# Altium footprint library 10-Diobe.PcbLib: 108 footprints (part 4 of 7)
Each footprint in its own frame and in the unit in brackets; x right, y up, seen from the top. Pads: shape width x height; smd on the part's side, far side on the other; paste and mask are expansions set on the pad; w line width, h text height; cw(c..) or ccw(c..) is an arc to the next point about the centre after c.
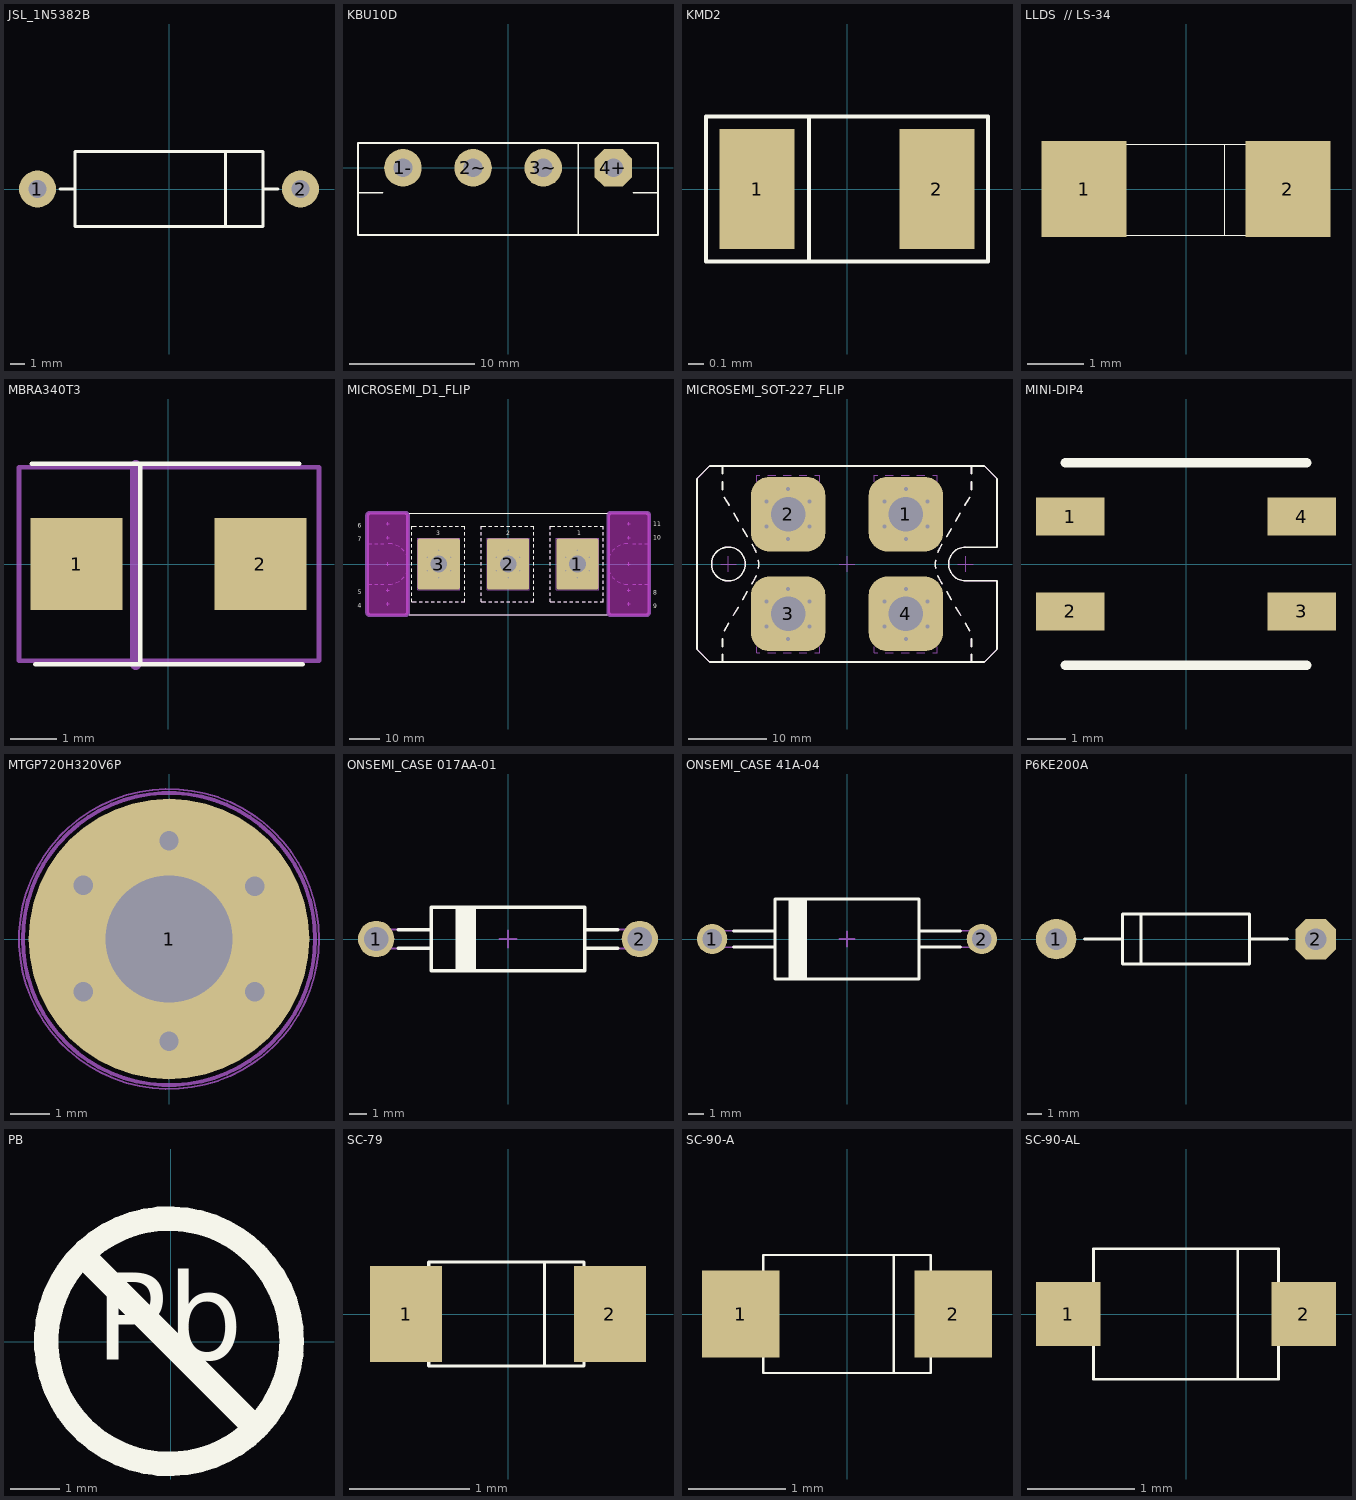
[diagram p3: the footprints below, top view; thin cyan lines are the x and y axes]

## JSL_1N5382B [mm]
height 12.22
pads (2):
  round 2.5 hole 1.2: 1(-8.89,0) 2(8.89,0)
Top Overlay:
  lines w0.2: -7.366,0 -6.35,0 ; 3.81,-2.54 3.81,2.54 ; 6.35,0 7.366,0 ; -6.35,-2.54 6.35,-2.54 6.35,2.54 -6.35,2.54 -6.35,-2.54
3D body "v280-170.stp": height 0.02, standoff -1.65, extent 7.49,-1.4 10.29,1.4
3D body "v280-170.stp": height 0.02, standoff -1.65, extent -10.29,-1.4 -7.49,1.4
3D body "1n5349.stp": height 3.81, standoff -2.5, extent -9.42,-1.905 9.42,1.907

## KBU10D [mm]
height 12.22
pads (4):
  round 3 hole 1.5: 1-(-8.4,0)
  round 3 hole 1.5 mask+0.07: 2~(-2.8,0) 3~(2.8,0)
  oct 3x3 hole 1.5 mask+0.07: 4+(8.4,0)
Top Overlay:
  lines w0.127: -11.913,-1.981 -10.033,-1.981 ; 5.588,-5.347 5.588,1.981 ; 10.008,-1.981 11.913,-1.981 ; -11.989,-5.359 -11.989,1.981 11.963,1.981 11.963,-5.359 -11.989,-5.359
3D body "kbu10x.stp": height 19.3, standoff -3.3, extent -11.85,-5.252 11.85,1.848
3D body "v280-170.stp": height 0.02, standoff -1.65, extent -9.8,-1.4 -7,1.4
3D body "v280-170.stp": height 0.02, standoff -1.65, extent -4.2,-1.4 -1.4,1.4
3D body "v280-170.stp": height 0.02, standoff -1.65, extent 1.4,-1.4 4.2,1.4
3D body "v280-170.stp": height 0.02, standoff -1.65, extent 7,-1.4 9.8,1.4

## KMD2 [mm]
height 12.22
pads (2):
  rect 0.5x0.8 smd mask+0.051: 1(-0.6,0) 2(0.6,0)
Top Overlay:
  lines w0.025: -0.254,-0.483 -0.254,0.483 ; -0.94,-0.483 -0.94,0.483 0.94,0.483 0.94,-0.483 -0.94,-0.483
3D body "kmd2.stp": height 0.6, standoff 0, extent -0.813,-0.406 0.787,0.394
3D body "p080-050.stp": height 0.02, standoff 0, extent 0.35,-0.4 0.85,0.4
3D body "p080-050.stp": height 0.02, standoff 0, extent -0.85,-0.4 -0.35,0.4

## LLDS  // LS-34 [mm] "DO35 // 1n4148"
height 12.22
pads (2):
  rect 1.5x1.7 smd mask+0.051: 1(-1.8,0) 2(1.8,0)
Top Overlay:
  lines w0.005: 0.686,-0.813 0.686,0.787 ; -1.88,-0.813 1.829,-0.813 1.829,0.787 -1.88,0.787 -1.88,-0.813
3D body "llds.stp": height 1.5, standoff 0, extent -1.7,-0.762 1.7,0.746
3D body "p170-150.stp": height 0.02, standoff 0, extent -2.55,-0.85 -1.05,0.85
3D body "p170-150.stp": height 0.02, standoff 0, extent 1.05,-0.85 2.55,0.85

## MBRA340T3 [mm]
height 12.22
pads (2):
  rect 2x2 smd: 1(-2,0) 2(2,0)
Top Overlay:
  lines w0.1: -2.972,2.184 2.845,2.184 ; -2.896,-2.184 2.921,-2.184 ; -0.61,-2.184 -0.61,2.184
Mechanical 11:
  lines w0.1: -3.251,-2.108 -3.251,2.108 3.277,2.108 3.277,-2.108 -3.251,-2.108
  lines w0.254: -0.711,-2.184 -0.711,2.134
3D body "2_2-1_6-ms73.stp": height 0.02, standoff 0, extent -3.01,-1.1 -1.41,1.1
3D body "2_2-1_6-ms73.stp": height 0.02, standoff 0, extent 1.435,-1.1 3.035,1.1
3D body "sma.stp": height 2.42, standoff 0, extent -3.185,-2.03 3.185,2.03

## MICROSEMI_D1_FLIP [mm] "MICROSEMI D1 Package Module, Body 94mm x 34mm, Screws on PCB Version"
height 31
pads (3):
  rrect10% 14x17 hole 5.5: 1(23,0) 2(0,0) 3(-23,0)
via 26.897,-2.25 diameter 1 hole 0.5
via 26.897,2.25 diameter 1 hole 0.5
via 19.103,-2.25 diameter 1 hole 0.5
via 23,4.5 diameter 1 hole 0.5
via 19.103,2.25 diameter 1 hole 0.5
via 23,-4.5 diameter 1 hole 0.5
via 0,-4.5 diameter 1 hole 0.5
via -3.897,2.25 diameter 1 hole 0.5
via 0,4.5 diameter 1 hole 0.5
via -3.897,-2.25 diameter 1 hole 0.5
via 3.897,2.25 diameter 1 hole 0.5
via 3.897,-2.25 diameter 1 hole 0.5
via -23,-4.5 diameter 1 hole 0.5
via -26.897,2.25 diameter 1 hole 0.5
via -23,4.5 diameter 1 hole 0.5
via -26.897,-2.25 diameter 1 hole 0.5
via -19.103,2.25 diameter 1 hole 0.5
via -19.103,-2.25 diameter 1 hole 0.5
Top Overlay:
  lines w0.2: -32.8,-16.906 32.8,-16.906 ; -32.8,16.894 32.8,16.894 ; -32,-11.494 -32,-12.506 -30.5,-12.506 ; -32,-10.494 -32,-9.494 ; -32,-8.494 -32,-7.494 ; -32,-6.494 -32,-5.494 ; -32,-4.494 -32,-3.494 ; -32,-2.494 -32,-1.494 ; -32,-0.494 -32,0.506 ; -32,1.506 -32,2.506 ; -32,3.506 -32,4.506 ; -32,5.506 -32,6.506 ; -32,7.506 -32,8.506 ; -32,9.506 -32,10.506 ; -32,11.506 -32,12.494 -30.5,12.494 ; -29.5,-12.506 -28.5,-12.506 ; -29.5,12.494 -28.5,12.494 ; -27.5,-12.506 -26.5,-12.506 ; -27.5,12.494 -26.5,12.494 ; -25.5,-12.506 -24.5,-12.506 ; -25.5,12.494 -24.5,12.494 ; -23.5,-12.506 -22.5,-12.506 ; -23.5,12.494 -22.5,12.494 ; -21.5,-12.506 -20.5,-12.506 ; -21.5,12.494 -20.5,12.494 ; -19.5,-12.506 -18.5,-12.506 ; -19.5,12.494 -18.5,12.494 ; -17.5,-12.506 -16.5,-12.506 ; -17.5,12.494 -16.5,12.494 ; -15.5,-12.506 -14.46,-12.506 -14.46,-11.494 ; -15.5,12.494 -14.46,12.494 -14.46,11.506 ; -14.46,-10.494 -14.46,-9.494 ; -14.46,-8.494 -14.46,-7.494 ; -14.46,-6.494 -14.46,-5.494 ; -14.46,-4.494 -14.46,-3.494 ; -14.46,-2.494 -14.46,-1.494 ; -14.46,-0.494 -14.46,0.506 ; -14.46,1.506 -14.46,2.506 ; -14.46,3.506 -14.46,4.506 ; -14.46,5.506 -14.46,6.506 ; -14.46,7.506 -14.46,8.506 ; -14.46,9.506 -14.46,10.506 ; -9,-11.494 -9,-12.506 -7.5,-12.506 ; -9,-10.494 -9,-9.494 ; -9,-8.494 -9,-7.494 ; -9,-6.494 -9,-5.494 ; -9,-4.494 -9,-3.494 ; -9,-2.494 -9,-1.494 ; -9,-0.494 -9,0.506 ; -9,1.506 -9,2.506 ; -9,3.506 -9,4.506 ; -9,5.506 -9,6.506 ; -9,7.506 -9,8.506 ; -9,9.506 -9,10.506 ; -9,11.506 -9,12.494 -7.5,12.494 ; -6.5,-12.506 -5.5,-12.506 ; -6.5,12.494 -5.5,12.494 ; -4.5,-12.506 -3.5,-12.506 ; -4.5,12.494 -3.5,12.494 ; -2.5,-12.506 -1.5,-12.506 ; -2.5,12.494 -1.5,12.494 ; -0.5,-12.506 0.5,-12.506 ; -0.5,12.494 0.5,12.494 ; 1.5,-12.506 2.5,-12.506 ; 1.5,12.494 2.5,12.494 ; 3.5,-12.506 4.5,-12.506 ; 3.5,12.494 4.5,12.494 ; 5.5,-12.506 6.5,-12.506 ; 5.5,12.494 6.5,12.494 ; 7.5,-12.506 8.54,-12.506 8.54,-11.494 ; 7.5,12.494 8.54,12.494 8.54,11.506 ; 8.54,-10.494 8.54,-9.494 ; 8.54,-8.494 8.54,-7.494 ; 8.54,-6.494 8.54,-5.494 ; 8.54,-4.494 8.54,-3.494 ; 8.54,-2.494 8.54,-1.494 ; 8.54,-0.494 8.54,0.506 ; 8.54,1.506 8.54,2.506 ; 8.54,3.506 8.54,4.506 ; 8.54,5.506 8.54,6.506 ; 8.54,7.506 8.54,8.506 ; 8.54,9.506 8.54,10.506 ; 14,-11.494 14,-12.506 15.5,-12.506 ; 14,-10.494 14,-9.494 ; 14,-8.494 14,-7.494 ; 14,-6.494 14,-5.494 ; 14,-4.494 14,-3.494 ; 14,-2.494 14,-1.494 ; 14,-0.494 14,0.506 ; 14,1.506 14,2.506 ; 14,3.506 14,4.506 ; 14,5.506 14,6.506 ; 14,7.506 14,8.506 ; 14,9.506 14,10.506 ; 14,11.506 14,12.494 15.5,12.494 ; 16.5,-12.506 17.5,-12.506 ; 16.5,12.494 17.5,12.494 ; 18.5,-12.506 19.5,-12.506 ; 18.5,12.494 19.5,12.494 ; 20.5,-12.506 21.5,-12.506 ; 20.5,12.494 21.5,12.494 ; 22.5,-12.506 23.5,-12.506 ; 22.5,12.494 23.5,12.494 ; 24.5,-12.506 25.5,-12.506 ; 24.5,12.494 25.5,12.494 ; 26.5,-12.506 27.5,-12.506 ; 26.5,12.494 27.5,12.494 ; 28.5,-12.506 29.5,-12.506 ; 28.5,12.494 29.5,12.494 ; 30.5,-12.506 31.54,-12.506 31.54,-11.494 ; 30.5,12.494 31.54,12.494 31.54,11.506 ; 31.54,-10.494 31.54,-9.494 ; 31.54,-8.494 31.54,-7.494 ; 31.54,-6.494 31.54,-5.494 ; 31.54,-4.494 31.54,-3.494 ; 31.54,-2.494 31.54,-1.494 ; 31.54,-0.494 31.54,0.506 ; 31.54,1.506 31.54,2.506 ; 31.54,3.506 31.54,4.506 ; 31.54,5.506 31.54,6.506 ; 31.54,7.506 31.54,8.506 ; 31.54,9.506 31.54,10.506
  text "9" at 48.206,-14.668 h1.5
  text "8" at 48.206,-10.164 h1.5
  text "10" at 48.109,8.011 h1.5
  text "11" at 48.109,12.512 h1.5
  text "6" at -49.796,12.004 h1.5
  text "7" at -49.796,7.503 h1.5
  text "5" at -49.796,-10.037 h1.5
  text "4" at -49.796,-14.541 h1.5
  text "1" at 22.848,9.5 h1.5
  text "2" at -0.647,9.5 h1.5
  text "3" at -23.761,9.5 h1.5
Keep-Out Layer:
  board cut-out: 33.2,-16 33.2,-16.099 33.238,-16.292 33.314,-16.474 33.423,-16.637 33.563,-16.777 33.726,-16.886 33.908,-16.962 34.102,-17 34.2,-17 45.8,-17 45.899,-17 46.092,-16.962 46.274,-16.886 46.437,-16.777 46.577,-16.637 46.686,-16.474 46.762,-16.292 46.8,-16.099 46.8,-16 46.8,16 46.8,16.098 46.762,16.292 46.686,16.474 46.577,16.637 46.437,16.777 46.274,16.886 46.092,16.962 45.899,17 45.8,17 34.2,17 34.102,17 33.908,16.962 33.726,16.886 33.563,16.777 33.423,16.637 33.314,16.474 33.238,16.292 33.2,16.098 33.2,16
  board cut-out: -46.8,-16 -46.8,-16.099 -46.762,-16.292 -46.686,-16.474 -46.577,-16.637 -46.437,-16.777 -46.274,-16.886 -46.092,-16.962 -45.899,-17 -45.8,-17 -34.2,-17 -34.102,-17 -33.908,-16.962 -33.726,-16.886 -33.563,-16.777 -33.423,-16.637 -33.314,-16.474 -33.238,-16.292 -33.2,-16.099 -33.2,-16 -33.2,16 -33.2,16.098 -33.238,16.292 -33.314,16.474 -33.423,16.637 -33.563,16.777 -33.726,16.886 -33.908,16.962 -34.102,17 -34.2,17 -45.8,17 -45.899,17 -46.092,16.962 -46.274,16.886 -46.437,16.777 -46.577,16.637 -46.686,16.474 -46.762,16.292 -46.8,16.098 -46.8,16
Mechanical 1:
  lines w1.27: -46.8,-16 ccw(c-45.8,-16) -45.8,-17 -34.2,-17 ccw(c-34.2,-16) -33.2,-16 -33.2,16 ccw(c-34.2,16) -34.2,17 -45.8,17 ccw(c-45.8,16) -46.8,16 -46.8,-16 ; 33.2,-16 ccw(c34.2,-16) 34.2,-17 45.8,-17 ccw(c45.8,-16) 46.8,-16 46.8,16 ccw(c45.8,16) 45.8,17 34.2,17 ccw(c34.2,16) 33.2,16 33.2,-16
Mechanical 8:
  drawing of 321 lines, arcs and shapes, not listed
Mechanical 14:
  drawing of 262 lines, arcs and shapes, not listed
  text "9" at 48.206,-14.668 h1.5
  text "8" at 48.206,-10.164 h1.5
  text "10" at 48.109,8.011 h1.5
  text "11" at 48.109,12.512 h1.5
  text "6" at -49.796,12.004 h1.5
  text "7" at -49.796,7.503 h1.5
  text "5" at -49.796,-10.037 h1.5
  text "4" at -49.796,-14.541 h1.5
  text "1" at 22.848,9.5 h1.5
  text "2" at -0.647,9.5 h1.5
  text "3" at -23.761,9.5 h1.5
Drill Drawing:
  lines w0.1: -46.2,5.878 -46.8,6.096 ; -46.2,6.314 -46.8,6.096 ; -43.652,-16.4 -43.434,-17 ; -43.652,16.4 -43.434,17 ; -43.216,-16.4 -43.434,-17 ; -43.216,16.4 -43.434,17 ; -40.5,0 -40,0 ; -40,-0.5 -40,0 ; -40,0.5 -40,0 ; -39.5,0 -40,0 ; -39.37,-15.886 -34.152,-15.886 -33.401,-16.637 ; -34.307,-16.214 -33.401,-16.637 ; -33.824,-15.731 -33.401,-16.637 ; -33.8,5.878 -33.2,6.096 ; -33.8,6.314 -33.2,6.096 ; 33.8,5.878 33.2,6.096 ; 33.8,6.314 33.2,6.096 ; 36.348,-16.4 36.566,-17 ; 36.348,16.4 36.566,17 ; 36.784,-16.4 36.566,-17 ; 36.784,16.4 36.566,17 ; 39.5,0 40,0 ; 40,-0.5 40,0 ; 40,0.5 40,0 ; 40.5,0 40,0 ; 40.63,-15.886 45.848,-15.886 46.599,-16.637 ; 45.693,-16.214 46.599,-16.637 ; 46.176,-15.731 46.599,-16.637 ; 46.2,5.878 46.8,6.096 ; 46.2,6.314 46.8,6.096 ; -46.8,6.096 -33.2,6.096 ; -43.434,-17 -43.434,17 ; 33.2,-16 ccw(c34.2,-16) 34.2,-17 ; 33.2,-16 ccw(c34.2,-16) 34.2,-17 ; 33.2,-16 33.2,16 ; 33.2,-16 33.2,16 ; 33.2,6.096 46.8,6.096 ; 33.2,16 cw(c34.2,16) 34.2,17 ; 33.2,16 cw(c34.2,16) 34.2,17 ; 34.2,-17 45.8,-17 ; 34.2,-17 45.8,-17 ; 34.2,17 45.8,17 ; 34.2,17 45.8,17 ; 36.566,-17 36.566,17 ; 45.8,-17 ccw(c45.8,-16) 46.8,-16 ; 45.8,-17 ccw(c45.8,-16) 46.8,-16 ; 45.8,17 cw(c45.8,16) 46.8,16 ; 45.8,17 cw(c45.8,16) 46.8,16 ; 46.8,-16 46.8,16 ; 46.8,-16 46.8,16 ; -46.8,-16 ccw(c-45.8,-16) -45.8,-17 -34.2,-17 ccw(c-34.2,-16) -33.2,-16 -33.2,16 ccw(c-34.2,16) -34.2,17 -45.8,17 ccw(c-45.8,16) -46.8,16 -46.8,-16
  text "34mm" at -43.942,-0.635 h0.9
  text "13.6mm" at -39.243,6.604 h0.9
  text "r =1mm" at -39.243,-15.621 h0.9
  text "r =1mm" at 40.757,-15.621 h0.9
  text "13.6mm" at 40.757,6.604 h0.9
  text "34mm" at 36.058,-0.635 h0.9
3D body "MICROSEMI_D1_FLIP_Part2.stp": height 10.4, standoff -5.27, extent -27.75,-4.75 27.75,4.75
3D body "MICROSEMI_D1_FLIP_Part1.stp": height 30.51, standoff 0, extent -47,-16.906 47,16.894

## MICROSEMI_SOT-227_FLIP [mm] "MICROSEMI SOT-227 (ISOTOP) Case, Body 38.2mm x 25.4mm, Screws on PCB Version"
height 12.2
pads (4):
  rrect50% 9.5x9.5 hole 4.4: 1(7.5,6.35) 2(-7.5,6.35) 3(-7.5,-6.35) 4(7.5,-6.35)
via 10.25,4.763 diameter 1 hole 0.5
via 7.5,3.175 diameter 1 hole 0.5
via 4.75,4.763 diameter 1 hole 0.5
via 4.75,7.938 diameter 1 hole 0.5
via 7.5,9.525 diameter 1 hole 0.5
via 10.25,7.938 diameter 1 hole 0.5
via -4.75,4.763 diameter 1 hole 0.5
via -7.5,3.175 diameter 1 hole 0.5
via -10.25,4.763 diameter 1 hole 0.5
via -10.25,7.938 diameter 1 hole 0.5
via -7.5,9.525 diameter 1 hole 0.5
via -4.75,7.938 diameter 1 hole 0.5
via 10.25,-7.938 diameter 1 hole 0.5
via 7.5,-9.525 diameter 1 hole 0.5
via 4.75,-7.938 diameter 1 hole 0.5
via 4.75,-4.763 diameter 1 hole 0.5
via 7.5,-3.175 diameter 1 hole 0.5
via 10.25,-4.763 diameter 1 hole 0.5
via -4.75,-7.938 diameter 1 hole 0.5
via -7.5,-9.525 diameter 1 hole 0.5
via -10.25,-7.938 diameter 1 hole 0.5
via -10.25,-4.763 diameter 1 hole 0.5
via -7.5,-3.175 diameter 1 hole 0.5
via -4.75,-4.763 diameter 1 hole 0.5
Top Overlay:
  circle w0.2: c-15.1,0 r2.15
  lines w0.2: -15.85,-11.521 -15.85,-12.479 ; -15.85,-10.521 -15.85,-9.521 ; -15.85,9.479 -15.85,10.479 ; -15.85,11.479 -15.85,12.479 ; -15.628,-8.521 -15.043,-7.521 ; -15.603,8.479 -15.018,7.479 ; -14.457,-6.521 -13.871,-5.521 ; -14.432,6.479 -13.847,5.479 ; -13.286,-4.521 -12.7,-3.521 ; -13.261,4.479 -12.676,3.479 ; -12.115,-2.521 -11.778,-1.945 ccw(c-15.1,0) -11.563,-1.521 ; -12.09,2.479 -11.778,1.945 cw(c-15.1,0) -11.545,1.479 ; -11.285,-0.521 ccw(c-15.1,0) -11.28,0.479 ; 11.28,0.479 ccw(c15.1,0) 11.285,-0.521 ; 11.545,1.479 cw(c15.1,0) 11.778,1.945 12.09,2.479 ; 11.563,-1.521 ccw(c15.1,0) 11.778,-1.945 12.115,-2.521 ; 12.676,3.479 13.261,4.479 ; 12.7,-3.521 13.286,-4.521 ; 13.847,5.479 14.432,6.479 ; 13.871,-5.521 14.457,-6.521 ; 15.018,7.479 15.603,8.479 ; 15.043,-7.521 15.628,-8.521 ; 15.85,-11.521 15.85,-12.479 ; 15.85,-10.521 15.85,-9.521 ; 15.85,9.479 15.85,10.479 ; 15.85,11.479 15.85,12.479 ; -15.85,-12.479 15.85,-12.479 ; -15.85,-12.479 -17.5,-12.479 -19.1,-10.879 -19.1,10.879 -17.5,12.479 -15.85,12.479 ; -15.85,12.479 15.85,12.479 ; 15.1,-2.15 cw(c15.1,0) 15.1,2.15 ; 15.1,-2.15 19.1,-2.15 ; 15.1,-2.15 19.1,-2.15 ; 15.1,2.15 19.1,2.15 ; 15.1,2.15 19.1,2.15 ; 15.85,-12.479 17.5,-12.479 19.1,-10.879 19.1,-2.15 ; 15.85,12.479 17.5,12.479 19.1,10.879 19.1,2.15
Mechanical 8:
  lines w0.1: -15.1,0 -16.1,0 -15.1,0 ; -15.1,0 -14.1,0 -15.1,0 ; -15.1,0 -15.1,1 -15.1,0 ; -15.1,0 -15.1,-1 -15.1,0 ; -7.5,-6.35 -8.5,-6.35 -7.5,-6.35 ; -7.5,-6.35 -6.5,-6.35 -7.5,-6.35 ; -7.5,-6.35 -7.5,-5.35 -7.5,-6.35 ; -7.5,-6.35 -7.5,-7.35 -7.5,-6.35 ; -7.5,6.35 -8.5,6.35 -7.5,6.35 ; -7.5,6.35 -6.5,6.35 -7.5,6.35 ; -7.5,6.35 -7.5,7.35 -7.5,6.35 ; -7.5,6.35 -7.5,5.35 -7.5,6.35 ; 0,0 -1,0 0,0 ; 0,0 1,0 0,0 ; 0,0 0,1 0,0 ; 0,0 0,-1 0,0 ; 7.5,-6.35 6.5,-6.35 7.5,-6.35 ; 7.5,-6.35 8.5,-6.35 7.5,-6.35 ; 7.5,-6.35 7.5,-5.35 7.5,-6.35 ; 7.5,-6.35 7.5,-7.35 7.5,-6.35 ; 7.5,6.35 6.5,6.35 7.5,6.35 ; 7.5,6.35 8.5,6.35 7.5,6.35 ; 7.5,6.35 7.5,7.35 7.5,6.35 ; 7.5,6.35 7.5,5.35 7.5,6.35 ; 15.1,0 14.1,0 15.1,0 ; 15.1,0 16.1,0 15.1,0 ; 15.1,0 15.1,1 15.1,0 ; 15.1,0 15.1,-1 15.1,0
Mechanical 14:
  circle w0.1: c-7.5,6.35 r2.2
  circle w0.1: c7.5,6.35 r2.2
  circle w0.1: c7.5,-6.35 r2.2
  circle w0.1: c-7.5,-6.35 r2.2
  circle w0.1: c-15.1,0 r2.15
  lines w0.1: -15.85,-11.521 -15.85,-12.479 ; -15.85,-10.521 -15.85,-9.521 ; -15.85,9.479 -15.85,10.479 ; -15.85,11.479 -15.85,12.479 ; -15.628,-8.521 -15.043,-7.521 ; -15.603,8.479 -15.018,7.479 ; -14.457,-6.521 -13.871,-5.521 ; -14.432,6.479 -13.847,5.479 ; -13.286,-4.521 -12.7,-3.521 ; -13.261,4.479 -12.676,3.479 ; -12.115,-2.521 -11.778,-1.945 ccw(c-15.1,0) -11.563,-1.521 ; -12.09,2.479 -11.778,1.945 cw(c-15.1,0) -11.545,1.479 ; -11.5,-10.521 -11.5,-11.314 -11.1,-11.314 ; -11.5,-9.521 -11.5,-8.521 ; -11.5,-7.521 -11.5,-6.521 ; -11.5,-5.521 -11.5,-4.521 ; -11.5,-3.521 -11.5,-3.342 ; -11.5,3.479 -11.5,3.342 -10.637,2.479 ; -11.5,4.479 -11.5,5.479 ; -11.5,6.479 -11.5,7.479 ; -11.5,8.479 -11.5,9.479 ; -11.5,10.479 -11.5,11.314 -11.1,11.314 ; -11.285,-0.521 ccw(c-15.1,0) -11.28,0.479 ; -10.1,-11.314 -9.1,-11.314 ; -10.1,11.314 -9.1,11.314 ; -10,1.842 -9.1,1.842 ; -8.1,-11.314 -7.1,-11.314 ; -8.1,1.842 -7.1,1.842 ; -8.1,11.314 -7.1,11.314 ; -6.1,-11.314 -5.1,-11.314 ; -6.1,1.842 -5.1,1.842 ; -6.1,11.314 -5.1,11.314 ; -5.1,-1.842 -6.1,-1.842 -5,-1.842 ; -4.363,2.479 -3.5,3.342 -3.5,3.479 ; -4.1,-11.314 -3.5,-11.314 -3.5,-10.521 ; -4.1,11.314 -3.5,11.314 -3.5,10.479 ; -3.5,-9.521 -3.5,-8.521 ; -3.5,-7.521 -3.5,-6.521 ; -3.5,-5.521 -3.5,-4.521 ; -3.5,-3.521 -3.5,-3.342 ; -3.5,4.479 -3.5,5.479 ; -3.5,6.479 -3.5,7.479 ; -3.5,8.479 -3.5,9.479 ; 3.5,-10.521 3.5,-11.314 3.9,-11.314 ; 3.5,-9.521 3.5,-8.521 ; 3.5,-7.521 3.5,-6.521 ; 3.5,-5.521 3.5,-4.521 ; 3.5,-3.521 3.5,-3.342 4.321,-2.521 ; 3.5,3.479 3.5,3.342 4.363,2.479 ; 3.5,4.479 3.5,5.479 ; 3.5,6.479 3.5,7.479 ; 3.5,8.479 3.5,9.479 ; 3.5,10.479 3.5,11.314 3.9,11.314 ; 4.9,-11.314 5.9,-11.314 ; 4.9,11.314 5.9,11.314 ; 5,-1.842 5.9,-1.842 ; 5,1.842 5.9,1.842 ; 6.9,-11.314 7.9,-11.314 ; 6.9,-1.842 7.9,-1.842 ; 6.9,1.842 7.9,1.842 ; 6.9,11.314 7.9,11.314 ; 8.9,-11.314 9.9,-11.314 ; 8.9,-1.842 9.9,-1.842 ; 8.9,1.842 9.9,1.842 ; 8.9,11.314 9.9,11.314 ; 10.637,2.479 11.5,3.342 11.5,3.479 ; 10.679,-2.521 11.5,-3.342 11.5,-3.521 ; 10.9,-11.314 11.5,-11.314 11.5,-10.521 ; 10.9,11.314 11.5,11.314 11.5,10.479 ; 11.28,0.479 ccw(c15.1,0) 11.285,-0.521 ; 11.5,-9.521 11.5,-8.521 ; 11.5,-7.521 11.5,-6.521 ; 11.5,-5.521 11.5,-4.521 ; 11.5,4.479 11.5,5.479 ; 11.5,6.479 11.5,7.479 ; 11.5,8.479 11.5,9.479 ; 11.545,1.479 cw(c15.1,0) 11.778,1.945 12.09,2.479 ; 11.563,-1.521 ccw(c15.1,0) 11.778,-1.945 12.115,-2.521 ; 12.676,3.479 13.261,4.479 ; 12.7,-3.521 13.286,-4.521 ; 13.847,5.479 14.432,6.479 ; 13.871,-5.521 14.457,-6.521 ; 15.018,7.479 15.603,8.479 ; 15.043,-7.521 15.628,-8.521 ; 15.85,-11.521 15.85,-12.479 ; 15.85,-10.521 15.85,-9.521 ; 15.85,9.479 15.85,10.479 ; 15.85,11.479 15.85,12.479 ; -15.85,-12.479 -17.5,-12.479 -19.1,-10.879 -19.1,10.879 -17.5,12.479 -15.85,12.479 ; -15.85,-12.479 15.85,-12.479 ; -15.85,12.479 15.85,12.479 ; -11.5,-3.342 -10.679,-2.521 -11.5,-3.342 ; -3.5,-3.342 -4.321,-2.521 -3.5,-3.342 ; 15.1,-2.15 cw(c15.1,0) 15.1,2.15 ; 15.1,-2.15 19.1,-2.15 ; 15.1,-2.15 19.1,-2.15 ; 15.1,2.15 19.1,2.15 ; 15.1,2.15 19.1,2.15 ; 15.85,-12.479 17.5,-12.479 19.1,-10.879 19.1,-2.15 ; 15.85,12.479 17.5,12.479 19.1,10.879 19.1,2.15 ; -10,-1.842 -9.1,-1.842 -10,-1.842 ; -8.1,-1.842 -7.1,-1.842 -8.1,-1.842
3D body "MICROSEMI_ISOTOP_FLIP_Part2.stp": height 10.24, standoff -4.69, extent -11.5,-10.365 11.5,10.365
3D body "MICROSEMI_ISOTOP_FLIP_Part1.stp": height 12.04, standoff 0, extent -19.1,-12.479 19.1,12.479

## MINI-DIP4 [mm]
height 12.2
pads (4):
  rect 1.8x1 smd: 1(-3.05,1.25) 2(-3.05,-1.25) 3(3.05,-1.25) 4(3.05,1.25)
Top Overlay:
  lines w0.254: -3.175,-2.667 3.175,-2.667 ; -3.175,2.667 3.175,2.667
3D body "p180-100.stp": height 0.02, standoff 0, extent 2.152,0.745 3.952,1.745
3D body "p180-100.stp": height 0.02, standoff 0, extent 2.152,-1.755 3.952,-0.755
3D body "p180-100.stp": height 0.02, standoff 0, extent -3.948,-1.755 -2.148,-0.755
3D body "p180-100.stp": height 0.02, standoff 0, extent -3.948,0.745 -2.148,1.745
3D body "mini-dip4.stp": height 1.55, standoff -0.06, extent -3.5,-2.35 3.5,2.35
3D body "mini-dip4pad.stp": height 0.01, standoff 0, extent -3.948,0.745 -2.148,1.745
3D body "mini-dip4pad.stp": height 0.01, standoff 0, extent -3.948,-1.744 -2.148,-0.744
3D body "mini-dip4pad.stp": height 0.01, standoff 0, extent 2.148,0.745 3.948,1.745
3D body "mini-dip4pad.stp": height 0.01, standoff 0, extent 2.148,-1.744 3.948,-0.744

## MTGP720H320V6P [mm]
pads (1):
  round 7.2 hole 3.25: 1(0,0)
via -2.2,-1.35 diameter 1 hole 0.5
via -2.2,1.375 diameter 1 hole 0.5
via 0,2.525 diameter 1 hole 0.5
via 2.2,1.35 diameter 1 hole 0.5
via 0,-2.625 diameter 1 hole 0.5
via 2.2,-1.35 diameter 1 hole 0.5
Mechanical 8:
  circle w0.1: c0,0 r2.6
  circle w0.1: c0,0 r3.75
  lines w0.1: -2.657,1.625 -2.224,1.375 ; -2.632,-1.6 -2.199,-1.35 ; -2.474,0.942 -2.224,1.375 ; -2.449,-0.917 -2.199,-1.35 ; -1.974,1.808 -2.224,1.375 ; -1.949,-1.783 -2.199,-1.35 ; -1.791,1.125 -2.224,1.375 ; -1.766,-1.1 -2.199,-1.35 ; -0.5,-2.625 0,-2.625 ; -0.5,0 0,0 ; -0.5,2.525 0,2.525 ; 0,-3.125 0,-2.625 ; 0,-2.125 0,-2.625 ; 0,-0.5 0,0 ; 0,0.5 0,0 ; 0,2.025 0,2.525 ; 0,3.025 0,2.525 ; 0.5,-2.625 0,-2.625 ; 0.5,0 0,0 ; 0.5,2.525 0,2.525 ; 1.766,-1.1 2.199,-1.35 ; 1.766,1.1 2.199,1.35 ; 1.949,-1.783 2.199,-1.35 ; 1.949,1.783 2.199,1.35 ; 2.449,-0.917 2.199,-1.35 ; 2.449,0.917 2.199,1.35 ; 2.632,-1.6 2.199,-1.35 ; 2.632,1.6 2.199,1.35
Mechanical 14:
  circle w0.1: c0,0 r3.75
Mechanical 15:
  circle w0.05: c0,0 r3.85
3D body "mtgp720h320v6p.stp": height 0.1, standoff -1.75, extent -3.627,-3.627 3.628,3.628

## ONSEMI_CASE 017AA-01 [mm] "ONSEMICONDUCTOR CASE 017AA-01, Diode, Axial; Lead Spacing 15.24mm, Lead Dia. 1.09mm, Body Length 8.89mm, Body Dia. 3.68mm"
height 3.68
pads (2):
  round 2.1 hole 1.4: 1(-7.62,0) 2(7.62,0)
Top Overlay:
  lines w0.2: -6.33,-0.545 -4.445,-0.545 ; -6.33,0.545 -4.445,0.545 ; -2.945,-1.84 -2.945,1.84 ; -2.77,-1.84 -2.77,1.84 ; -2.62,-1.84 -2.62,1.84 ; -2.495,-1.84 -2.495,1.84 ; -2.295,-1.84 -2.295,1.84 ; -2.12,-1.84 -2.12,1.84 ; -1.945,-1.84 -1.945,1.84 ; 4.445,-0.545 6.33,-0.545 ; 4.445,0.545 6.33,0.545 ; -4.445,-1.84 -4.445,1.84 4.445,1.84 4.445,-1.84 -4.445,-1.84
Mechanical 8:
  lines w0.1: -8.12,0 -7.62,0 ; -7.62,-0.5 -7.62,0 ; -7.62,0.5 -7.62,0 ; -7.12,0 -7.62,0 ; -0.5,0 0,0 ; 0,-0.5 0,0 ; 0,0.5 0,0 ; 0.5,0 0,0 ; 7.12,0 7.62,0 ; 7.62,-0.5 7.62,0 ; 7.62,0.5 7.62,0 ; 8.12,0 7.62,0
Mechanical 14:
  lines w0.1: -4.445,-0.545 -7.62,-0.545 cw(c-7.62,0) -7.62,0.545 -4.445,0.545 ; -2.945,-1.84 -2.945,1.84 ; -2.845,-1.84 -2.845,1.84 ; -2.77,-1.84 -2.77,1.84 ; -2.695,-1.84 -2.695,1.84 ; -2.62,-1.84 -2.62,1.84 ; -2.545,-1.84 -2.545,1.84 ; -2.47,-1.84 -2.47,1.84 ; -2.37,-1.84 -2.37,1.84 ; -2.295,-1.84 -2.295,1.84 ; -2.195,-1.84 -2.195,1.84 ; -2.12,-1.84 -2.12,1.84 ; -2.045,-1.84 -2.045,1.84 ; -1.945,-1.84 -1.945,1.84 ; 4.445,-0.545 7.62,-0.545 ccw(c7.62,0) 7.62,0.545 4.445,0.545 ; -4.445,-1.84 -4.445,1.84 4.445,1.84 4.445,-1.84 -4.445,-1.84
3D body "v220-150.stp": height 0.02, standoff -1.65, extent 6.52,-1.1 8.72,1.1
3D body "v220-150.stp": height 0.02, standoff -1.65, extent -8.72,-1.1 -6.52,1.1
3D body "ON SEMI_CASE 017AA-01.stp": height 3.68, standoff -3.6, extent -8.165,-1.84 8.165,1.84

## ONSEMI_CASE 41A-04 [mm] "ONSEMICONDUCTOR CASE 41A-04, Diode, Axial; Lead Spacing 15.24mm, Lead Dia. 1.06mm, Body Length 9mm, Body Dia. 5.05mm"
height 3.68
pads (2):
  round 2 hole 1.3: 1(-8.89,0) 2(8.89,0)
Top Overlay:
  lines w0.2: -7.487,-0.53 -4.75,-0.53 ; -7.487,0.53 -4.75,0.53 ; -3.75,-2.65 -3.75,2.65 ; -3.55,-2.65 -3.55,2.65 ; -3.35,-2.65 -3.35,2.65 ; -3.15,-2.65 -3.15,2.65 ; -2.95,-2.65 -2.95,2.65 ; -2.75,-2.65 -2.75,2.65 ; 4.75,-0.53 7.487,-0.53 ; 4.75,0.53 7.487,0.53 ; -4.75,-2.65 -4.75,2.65 4.75,2.65 4.75,-2.65 -4.75,-2.65
Mechanical 8:
  lines w0.1: -9.39,0 -8.89,0 ; -8.89,-0.5 -8.89,0 ; -8.89,0.5 -8.89,0 ; -8.39,0 -8.89,0 ; -0.5,0 0,0 ; 0,-0.5 0,0 ; 0,0.5 0,0 ; 0.5,0 0,0 ; 8.39,0 8.89,0 ; 8.89,-0.5 8.89,0 ; 8.89,0.5 8.89,0 ; 9.39,0 8.89,0
Mechanical 14:
  lines w0.1: -4.75,-0.53 -8.89,-0.53 cw(c-8.89,0) -8.89,0.53 -4.75,0.53 ; -3.75,-2.65 -3.75,2.65 ; -3.55,-2.65 -3.55,2.65 ; -3.35,-2.65 -3.35,2.65 ; -3.15,-2.65 -3.15,2.65 ; -2.95,-2.65 -2.95,2.65 ; -2.75,-2.65 -2.75,2.65 ; 4.75,-0.53 8.89,-0.53 ccw(c8.89,0) 8.89,0.53 4.75,0.53 ; -4.75,-2.65 -4.75,2.65 4.75,2.65 4.75,-2.65 -4.75,-2.65
3D body "ONSEMI_CASE 41A-04.stp": height 5.3, standoff -3.8, extent -9.42,-2.65 9.42,2.65
3D body "v220-150.stp": height 0.02, standoff -1.65, extent -9.99,-1.1 -7.79,1.1
3D body "v220-150.stp": height 0.02, standoff -1.65, extent 7.79,-1.1 9.99,1.1

## P6KE200A [mm]
height 3.68
pads (2):
  round 2.8 hole 1.5: 1(-9,0)
  oct 2.8x2.8 hole 1.5 mask+0.07: 2(9,0)
Top Overlay:
  lines w0.2: -7.033,0 -4.458,0 ; -3.111,-1.702 -3.111,1.74 ; 4.391,0 7.033,0 ; -4.4,-1.74 4.4,-1.74 4.4,1.753 -4.4,1.753 -4.4,-1.74
3D body "y2_8-2_8.stp": height 0.02, standoff 0, extent -10.4,-1.4 -7.6,1.4
3D body "d18a.stp": height 5.25, standoff -3.5, extent -9.575,-1.745 9.575,1.745
3D body "f2_8-2_8.stp": height 0.02, standoff 0, extent 7.579,-1.413 10.379,1.387

## PB [mm]
Top Overlay:
  circle w0.5: c-0.031,0.013 r2.5
  lines w0.5: -1.737,1.719 1.675,-1.693
  text "Pb" at -1.536,-0.948 h3.05
3D body "pb.stp": height 0.02, standoff 0, extent -2.725,-2.725 2.725,2.725

## SC-79 [mm] "&EMD2&SOD-523"
height 3.68
pads (2):
  rect 0.6x0.8 smd mask+0.051: 1(-0.85,0) 2(0.85,0)
Top Overlay:
  lines w0.005: -0.746,-0.16 -0.746,0.18 ; -0.676,-0.16 -0.813,-0.16 -0.813,0.18 -0.676,0.18 ; 0.625,-0.18 0.762,-0.18 0.762,0.16 0.625,0.16 ; 0.695,-0.18 0.695,0.16
  lines w0.025: 0.305,-0.432 0.305,0.432 ; -0.66,-0.432 0.635,-0.432 0.635,0.432 -0.66,0.432 -0.66,-0.432
3D body "p080-050.stp": height 0.02, standoff 0, extent -1.1,-0.4 -0.6,0.4
3D body "p080-050.stp": height 0.02, standoff 0, extent 0.6,-0.4 1.1,0.4
3D body "sc-79.stp": height 0.6, standoff 0, extent -0.8,-0.406 0.8,0.394

## SC-90-A [mm] "SOD323 // UMD2"
height 3.68
pads (2):
  rect 0.8x0.9 smd mask+0.051: 1(-1.1,0) 2(1.1,0)
Top Overlay:
  lines w0.005: -0.949,-0.16 -0.949,0.18 ; -0.879,-0.16 -1.229,-0.16 -1.229,0.18 -0.879,0.18 ; 0.854,-0.18 1.204,-0.18 1.204,0.16 0.854,0.16 ; 0.924,-0.18 0.924,0.16
  lines w0.025: 0.483,-0.61 0.483,0.61 ; -0.864,-0.61 0.864,-0.61 0.864,0.61 -0.864,0.61 -0.864,-0.61
3D body "p090-080.stp": height 0.02, standoff 0, extent 0.7,-0.45 1.5,0.45
3D body "p090-080.stp": height 0.02, standoff 0, extent -1.5,-0.45 -0.7,0.45
3D body "sc90-a.stp": height 0.69, standoff 0, extent -1.25,-0.615 1.25,0.635

## SC-90-AL [mm] "SOD323 // UMD2"
height 3.68
pads (2):
  rect 0.6x0.6 smd mask+0.051: 1(-1.1,0) 2(1.1,0)
Top Overlay:
  lines w0.005: -0.949,-0.16 -0.949,0.18 ; -0.879,-0.16 -1.229,-0.16 -1.229,0.18 -0.879,0.18 ; 0.854,-0.18 1.204,-0.18 1.204,0.16 0.854,0.16 ; 0.924,-0.18 0.924,0.16
  lines w0.025: 0.483,-0.61 0.483,0.61 ; -0.864,-0.61 -0.864,0.61 0.864,0.61 0.864,-0.61 -0.864,-0.61
3D body "sc90-a.stp": height 0.69, standoff 0, extent -1.25,-0.615 1.25,0.635
3D body "p090-080.stp": height 0.02, standoff 0, extent -1.5,-0.45 -0.7,0.45
3D body "p090-080.stp": height 0.02, standoff 0, extent 0.7,-0.45 1.5,0.45